# Altium footprint library OT Library.PcbLib: 396 footprints (part 1 of 25)
Each footprint in its own frame and in the unit in brackets; x right, y up, seen from the top. Pads: shape width x height; smd on the part's side, far side on the other; paste and mask are expansions set on the pad; w line width, h text height; cw(c..) or ccw(c..) is an arc to the next point about the centre after c.
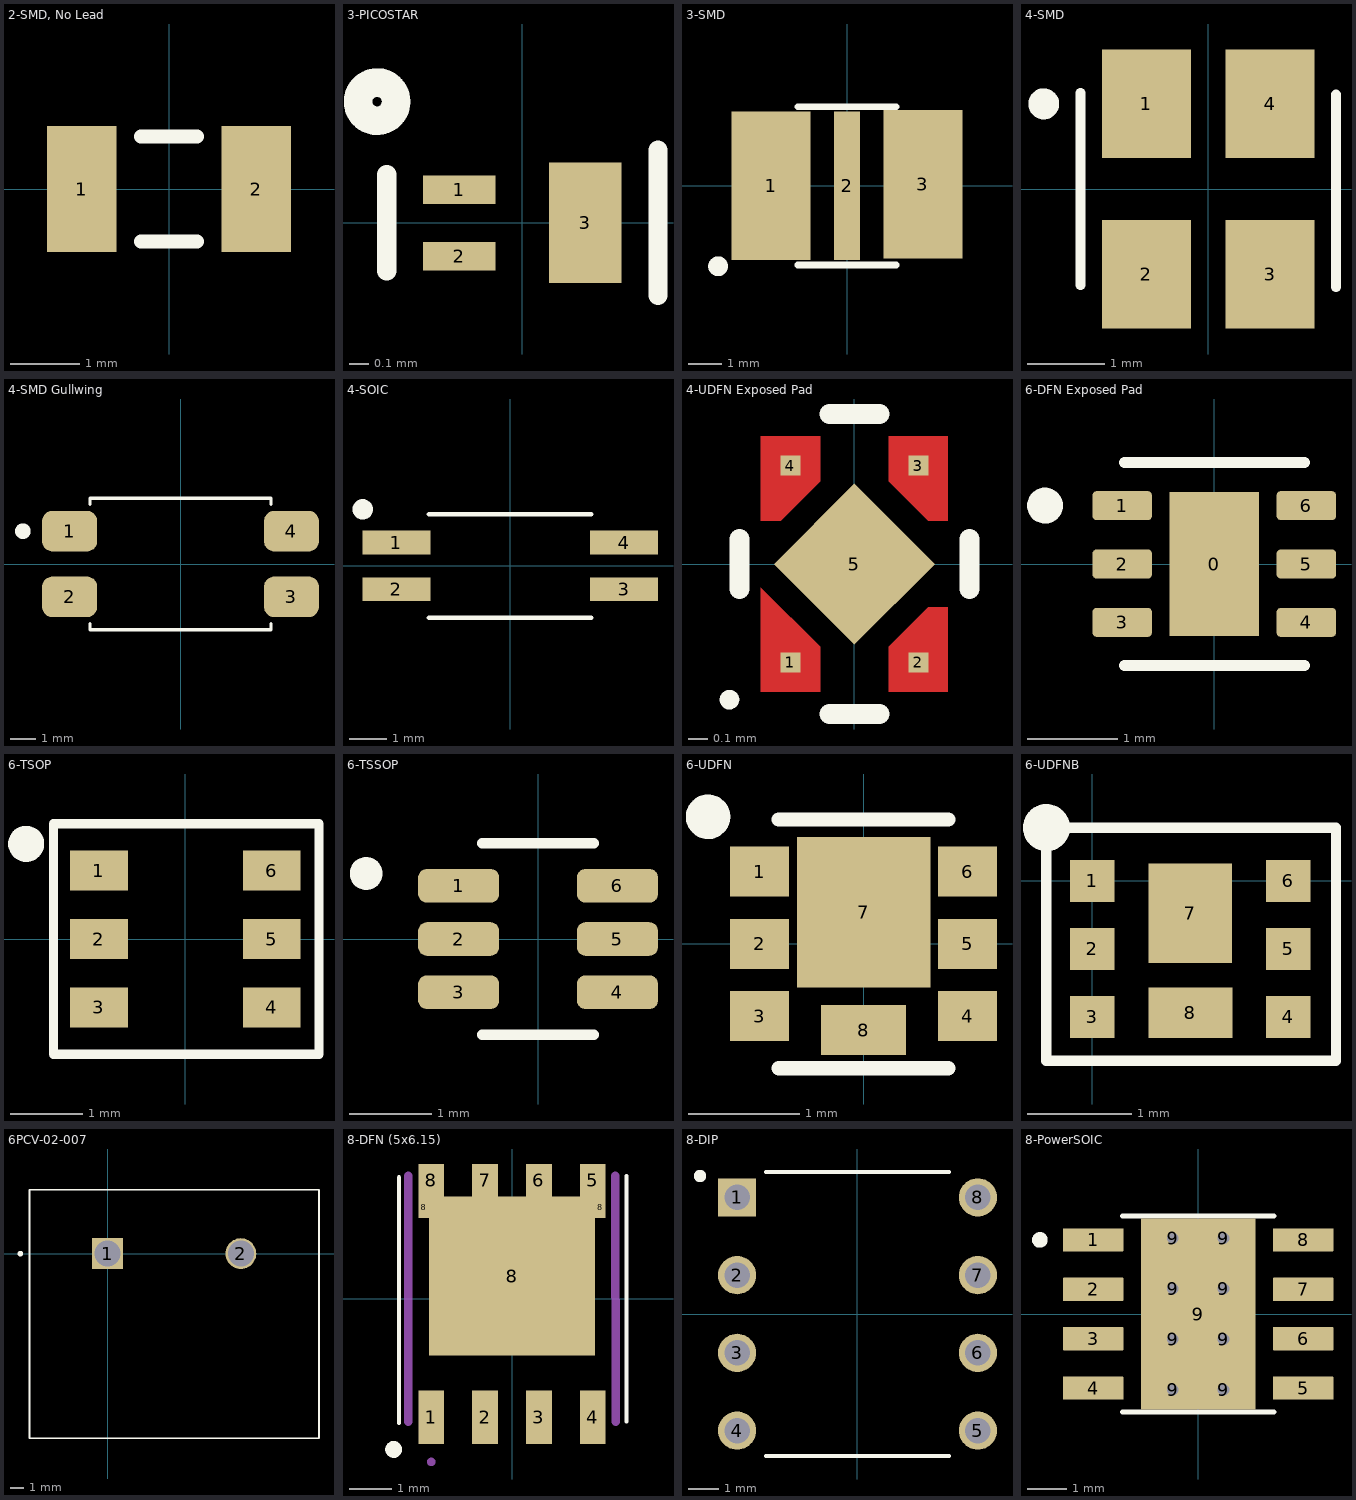
[diagram p0: the footprints below, top view; thin cyan lines are the x and y axes]

## 2-SMD, No Lead [mm] "0.126\" L x 0.059\" W (3.20mm x 1.50mm)"
pads (2):
  rect 1x1.8 smd: 1(-1.25,0) 2(1.25,0)
Top Overlay:
  lines w0.2: -0.4,-0.75 0.4,-0.75 ; -0.4,0.75 0.4,0.75
3D body: height 0.84, standoff 0, extent -1.651,-0.8 1.651,0.8

## 3-PICOSTAR [mm] "3-XFDFN"
pads (3):
  rect 0.38x0.15 smd: 1(-0.33,0.174) 2(-0.33,-0.175)
  rect 0.38x0.63 smd: 3(0.33,0)
Top Overlay:
  circle w0.15: c-0.762,0.635 r0.1
  lines w0.1: -0.711,-0.254 -0.711,0.254 ; 0.711,-0.381 0.711,0.381
3D body: height 0.35, standoff 0, extent -0.5,-0.3 0.5,0.3

## 3-SMD [mm] "3-SMD (6.5x4)"
pads (3):
  rect 2.4x4.5 smd paste-3 mask+0: 1(-2.3,0) 3(2.3,0.05)
  rect 0.8x4.5 smd paste-3 mask+0: 2(0,0)
Top Overlay:
  circle w0.3: c-3.912,-2.438 r0.15
  lines w0.2: -1.5,-2.4 1.5,-2.4 ; -1.5,2.4 1.5,2.4
Top Paste:
  region: 2.925,-1.678 1.127,-1.678 1.127,1.675 2.925,1.675
  region: 0.375,-1.675 -0.375,-1.675 -0.375,1.675 0.375,1.675
  region: -1.125,-1.677 -2.929,-1.677 -2.929,1.675 -1.125,1.675
Top Solder:
  region: 0.4,-1.7 -0.4,-1.7 -0.4,1.7 0.4,1.7
  region: -1.1,-1.701 -2.952,-1.701 -2.952,1.7 -1.1,1.7
  region: 2.95,-1.701 1.101,-1.701 1.101,1.7 2.95,1.7
3D body: height 1, standoff 0, extent -3.25,-2 3.25,2

## 4-SMD [mm] "0.126\" L x 0.098\" W (3.20mm x 2.50mm)"
height 0.6
pads (4):
  rect 1.15x1.4 smd: 1(-0.8,1.1) 2(-0.8,-1.1) 3(0.8,-1.1) 4(0.8,1.1)
Top Overlay:
  circle w0.2: c-2.125,1.1 r0.1
  lines w0.127: -1.651,-1.245 -1.651,1.245 ; 1.651,-1.27 1.651,1.219
3D body: height 0.6, standoff 0, extent -1.6,-1.25 1.6,1.25

## 4-SMD Gullwing [mm]
pads (4):
  rrect50% 2.13x1.57 smd: 1(-4.29,1.27) 2(-4.29,-1.27) 3(4.29,-1.27) 4(4.29,1.27)
Top Overlay:
  circle w0.3: c-6.1,1.27 r0.15
  lines w0.127: -3.5,-2.304 -3.5,-2.54 3.5,-2.54 3.5,-2.304 ; -3.5,2.304 -3.5,2.54 3.5,2.54 3.5,2.304
3D body: height 4, standoff 0, extent -4.875,-2.29 4.875,2.29

## 4-SOIC [mm] "4-SSOP (0.173\", 4.40mm Width)"
pads (4):
  rect 1.84x0.64 smd: 1(-3.085,0.635) 2(-3.085,-0.635) 3(3.085,-0.635) 4(3.085,0.635)
Top Overlay:
  circle w0.3: c-3.999,1.535 r0.127
  lines w0.127: -2.2,-1.4 2.2,-1.4 ; -2.2,1.4 2.2,1.4
3D body: height 2, standoff -0.02, extent -3.5,-1.33 3.5,1.37

## 4-UDFN Exposed Pad [mm] "4-UDFN (1.0x1.0)"
pads (5):
  rect 0.1x0.1 smd paste-1 mask+0: 1(-0.325,-0.5) 2(0.325,-0.5) 3(0.325,0.5) 4(-0.325,0.5)
  rect 0.58x0.58 smd rot 45 mask+0.061: 5(0,0)
Top Layer:
  region: -0.175,-0.42 -0.175,-0.65 -0.475,-0.65 -0.475,-0.12
  region: 0.475,-0.65 0.175,-0.65 0.175,-0.42 0.375,-0.22 0.475,-0.22
  region: 0.475,0.22 0.375,0.22 0.175,0.42 0.175,0.65 0.475,0.65
  region: -0.175,0.42 -0.375,0.22 -0.475,0.22 -0.475,0.65 -0.175,0.65
Top Overlay:
  circle w0.05: c-0.635,-0.689 r0.025
  lines w0.102: -0.584,-0.127 -0.584,0.127 ; -0.127,-0.762 0.127,-0.762 ; -0.127,0.762 0.127,0.762 ; 0.584,-0.127 0.584,0.127
Top Paste:
  region: -0.175,-0.42 -0.175,-0.65 -0.475,-0.65 -0.475,-0.12
  region: 0.475,-0.65 0.175,-0.65 0.175,-0.42 0.375,-0.22 0.475,-0.22
  region: 0.475,0.22 0.375,0.22 0.175,0.42 0.175,0.65 0.475,0.65
  region: -0.175,0.42 -0.375,0.22 -0.475,0.22 -0.475,0.65 -0.175,0.65
Top Solder:
  region: -0.125,-0.4 -0.125,-0.7 -0.525,-0.7 -0.525,-0.05 -0.475,-0.05
  region: 0.525,0.175 0.35,0.175 0.125,0.4 0.125,0.7 0.525,0.7
  region: 0.525,-0.7 0.125,-0.7 0.125,-0.4 0.35,-0.175 0.525,-0.175
  region: -0.125,0.4 -0.35,0.175 -0.525,0.175 -0.525,0.7 -0.125,0.7
3D body: height 0.58, standoff -0.03, extent -0.5,-0.5 0.5,0.5

## 6-DFN Exposed Pad [mm] "6-MCM (1.7x2.3)"
pads (7):
  rect 1x1.6 smd paste-2: 0(0,0)
  rrect25% 0.66x0.32 smd: 1(-1.025,0.65) 2(-1.025,0) 3(-1.025,-0.65) 4(1.025,-0.65) 5(1.025,0) 6(1.025,0.65)
Top Overlay:
  circle w0.2: c-1.885,0.65 r0.1
  lines w0.127: -1,-1.13 1,-1.13 ; -1,1.13 1,1.13
Top Paste:
  region: 0.32,-0.51 -0.32,-0.51 -0.32,0.51 0.32,0.51
3D body: height 0.9, standoff 0, extent -1,-1 1,1

## 6-TSOP [mm] "SC-74, SOT-457"
pads (6):
  rect 0.8x0.55 smd: 1(-1.2,0.95) 2(-1.2,0) 3(-1.2,-0.95) 4(1.2,-0.95) 5(1.2,0) 6(1.2,0.95)
Top Overlay:
  circle w0.3: c-2.21,1.321 r0.1
  lines w0.127: -1.829,-1.6 -1.829,1.6 -0.4,1.6 0.4,1.6 1.854,1.6 1.854,-1.6 -1.829,-1.6
3D body: height 0.97, standoff -0.05, extent -1.435,-1.532 1.435,1.532

## 6-TSSOP [mm] "6-TSSOP, SC-88, SOT-363"
pads (6):
  rrect50% 0.99x0.41 smd: 1(-0.97,0.65) 2(-0.97,0) 3(-0.97,-0.65) 4(0.97,-0.65) 5(0.97,0) 6(0.97,0.65)
Top Overlay:
  circle w0.2: c-2.1,0.8 r0.1
  lines w0.127: -0.68,-1.169 0.68,-1.169 ; -0.68,1.169 0.68,1.169
3D body: height 1.1, standoff 0, extent -1.05,-1 1.05,1

## 6-UDFN [mm] "DFN2020MD-6"
pads (8):
  rect 0.53x0.45 smd paste-0.1 mask-0.05: 1(-0.935,0.65) 2(-0.935,0) 3(-0.935,-0.65) 4(0.935,-0.65) 5(0.935,0) 6(0.935,0.65)
  rect 1.2x1.35 smd paste-0.15 mask-0.05: 7(0,0.285)
  rect 0.76x0.45 smd paste-0.1 mask-0.05: 8(0,-0.775)
Top Overlay:
  circle w0.2: c-1.397,1.143 r0.1
  lines w0.127: -0.762,-1.118 0.762,-1.118 ; -0.762,1.118 0.762,1.118
3D body: height 0.65, standoff 0, extent -1.02,-1 1.02,1

## 6-UDFNB [mm] "6-WDFN Exposed Pad"
height 0.75
pads (8):
  rect 0.425x0.4 smd: 1(0,0) 2(0,-0.65) 3(0,-1.3) 4(1.875,-1.3) 5(1.875,-0.65) 6(1.875,0)
  rect 0.8x0.95 smd: 7(0.937,-0.31)
  rect 0.8x0.48 smd: 8(0.937,-1.26)
Top Overlay:
  circle w0.25: c-0.44,0.51 r0.1
  lines w0.1: -0.44,-1.72 2.33,-1.72 2.33,0.51 -0.44,0.51 -0.44,-1.72
3D body: height 0.77, standoff 0, extent -0.06,-1.65 1.94,0.35

## 6PCV-02-007 [mm]
pads (2):
  rect 2.204x2.204 hole 1.854: 1(0,0)
  round 2.204 hole 1.854: 2(9.53,0)
Top Overlay:
  circle w0.2: c-6.238,0 r0.1
  lines w0.127: -5.588,-13.208 15.118,-13.208 15.118,4.572 -5.588,4.572 -5.588,-13.208
3D body: height 16.26, standoff -4.69, extent -5.474,-13.259 15.126,4.521

## 8-DFN (5x6.15) [mm] "8-PowerVDFN"
pads (11):
  rect 0.61x1.27 smd: 1(-1.905,-2.795) 2(-0.635,-2.795) 3(0.635,-2.795) 4(1.905,-2.795)
  rect 0.61x0.77 smd: 5(1.905,2.795) 6(0.635,2.795) 7(-0.635,2.795) 8(-1.905,2.795)
  rect 0.255x0.5 smd: 8(-2.083,2.16) 8(2.083,2.16)
  rect 3.91x3.75 smd: 8(0,0.535)
Top Overlay:
  circle w0.2: c-2.794,-3.556 r0.1
  lines w0.1: -2.667,-2.93 -2.667,2.87 ; 2.704,-2.9 2.704,2.9
Mechanical 22:
  lines w0.1: -1.905,-3.9 ccw(c-1.905,-3.85) -1.905,-3.8 ccw(c-1.905,-3.85) -1.905,-3.9
  lines w0.2: -2.45,-2.9 -2.45,2.9 ; 2.44,2.9 2.45,-2.9
3D body: height 0.99, standoff 0, extent -2.553,-3.251 2.553,2.997

## 8-DIP [mm] "8-DIP (0.300\", 7.62mm)"
height 5.334
pads (8):
  rect 1.25x1.25 / inner round 1.25 / far side rect 1.25x1.25 hole 0.83: 1(-3.935,3.81)
  round 1.25 hole 0.83: 2(-3.935,1.27) 3(-3.935,-1.27) 4(-3.935,-3.81) 5(3.935,-3.81) 6(3.935,-1.27) 7(3.935,1.27) 8(3.935,3.81)
Top Overlay:
  circle w0.2: c-5.145,4.51 r0.1
  lines w0.127: -2.99,-4.64 2.99,-4.64 ; -2.99,4.64 2.99,4.64
3D body: height 5.48, standoff -3.67, extent -3.937,-4.635 3.937,4.636

## 8-PowerSOIC [mm] "8-SO PowerPad (0.154\", 3.90mm Width)"
pads (17):
  rrect5% 1.55x0.6 smd mask+0: 1(-2.7,1.905) 2(-2.7,0.635) 3(-2.7,-0.635) 4(-2.7,-1.905) 5(2.7,-1.905) 6(2.7,-0.635) 7(2.7,0.635) 8(2.7,1.905)
  round 0.6 hole 0.3: 9(-0.65,-1.95) 9(-0.65,-0.65) 9(-0.65,0.65) 9(-0.65,1.95) 9(0.65,-1.95) 9(0.65,-0.65) 9(0.65,0.65) 9(0.65,1.95)
  rect 2.95x4.9 smd paste-3 mask+0: 9(0,0)
Top Overlay:
  circle w0.2: c-4.07,1.905 r0.1
  lines w0.127: -1.95,-2.525 1.95,-2.525 ; -1.95,2.525 1.95,2.525
Top Paste:
  region: 1.355,-1.7 -1.355,-1.7 -1.355,1.7 1.355,1.7
Top Solder:
  drawing of 9 lines, arcs and shapes, not listed
3D body: height 1.7, standoff 0, extent -3,-2.45 3,2.45